# Altium footprint library Conectors.PcbLib: 123 footprints (part 7 of 8)
Each footprint in its own frame and in the unit in brackets; x right, y up, seen from the top. Pads: shape width x height; smd on the part's side, far side on the other; paste and mask are expansions set on the pad; w line width, h text height; cw(c..) or ccw(c..) is an arc to the next point about the centre after c.
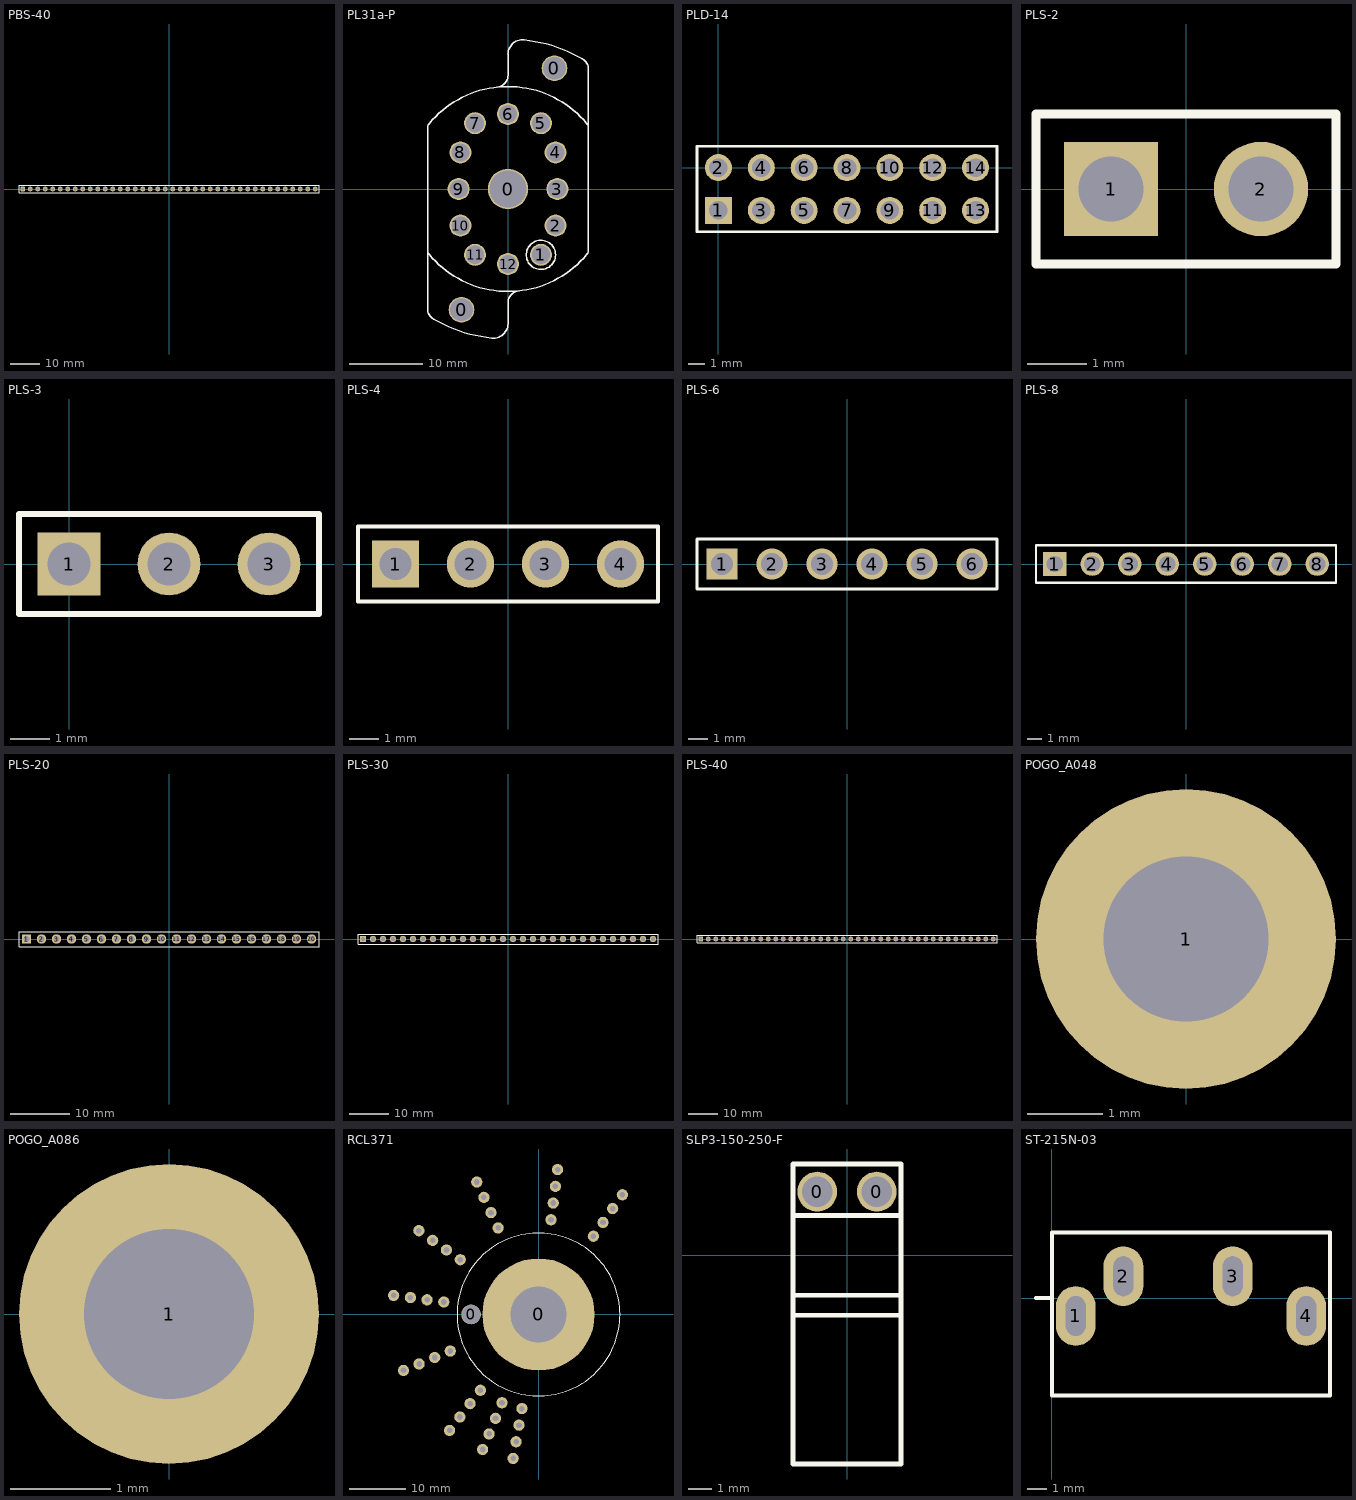
[diagram p6: the footprints below, top view; thin cyan lines are the x and y axes]

## PBS-40 [mm]
pads (40):
  rrect50% 1.6x1.6 hole 1.1: 1(-49.53,0)
  round 1.6 hole 1.1: 2(-46.99,0) 3(-44.45,0) 4(-41.91,0) 5(-39.37,0) 6(-36.83,0) 7(-34.29,0) 8(-31.75,0) 9(-29.21,0) 10(-26.67,0) 11(-24.13,0) 12(-21.59,0) 13(-19.05,0) 14(-16.51,0) 15(-13.97,0) 16(-11.43,0) 17(-8.89,0) 18(-6.35,0) 19(-3.81,0) 20(-1.27,0) 21(1.27,0) 22(3.81,0) 23(6.35,0) 24(8.89,0) 25(11.43,0) 26(13.97,0) 27(16.51,0) 28(19.05,0) 29(21.59,0) 30(24.13,0) 31(26.67,0) 32(29.21,0) 33(31.75,0) 34(34.29,0) 35(36.83,0) 36(39.37,0) 37(41.91,0) 38(44.45,0) 39(46.99,0) 40(49.53,0)
Top Overlay:
  lines w0.15: -50.8,-1.27 0,-1.27 50.8,-1.27 50.8,1.27 0,1.27 -50.8,1.27 -50.8,-1.27
3D body "User Library-DS1023.STEP": height 8.5, standoff -3, extent 30.48,-1.27 33.02,1.27
3D body "User Library-DS1023.STEP": height 8.5, standoff -3, extent 33.02,-1.27 35.56,1.27
3D body "User Library-DS1023.STEP": height 8.5, standoff -3, extent 35.56,-1.27 38.1,1.27
3D body "User Library-DS1023.STEP": height 8.5, standoff -3, extent 38.1,-1.27 40.64,1.27
3D body "User Library-DS1023.STEP": height 8.5, standoff -3, extent 40.64,-1.27 43.18,1.27
3D body "User Library-DS1023.STEP": height 8.5, standoff -3, extent 43.18,-1.27 45.72,1.27
3D body "User Library-DS1023.STEP": height 8.5, standoff -3, extent 45.72,-1.27 48.26,1.27
3D body "User Library-DS1023.STEP": height 8.5, standoff -3, extent 48.26,-1.27 50.8,1.27
3D body "User Library-DS1023.STEP": height 8.5, standoff -3, extent 25.4,-1.27 27.94,1.27
3D body "User Library-DS1023.STEP": height 8.5, standoff -3, extent 27.94,-1.27 30.48,1.27
3D body "User Library-DS1023.STEP": height 8.5, standoff -3, extent 17.78,-1.27 20.32,1.27
3D body "User Library-DS1023.STEP": height 8.5, standoff -3, extent 15.24,-1.27 17.78,1.27
3D body "User Library-DS1023.STEP": height 8.5, standoff -3, extent 12.7,-1.27 15.24,1.27
3D body "User Library-DS1023.STEP": height 8.5, standoff -3, extent 10.16,-1.27 12.7,1.27
3D body "User Library-DS1023.STEP": height 8.5, standoff -3, extent 7.62,-1.27 10.16,1.27
3D body "User Library-DS1023.STEP": height 8.5, standoff -3, extent 5.08,-1.27 7.62,1.27
3D body "User Library-DS1023.STEP": height 8.5, standoff -3, extent 2.54,-1.27 5.08,1.27
3D body "User Library-DS1023.STEP": height 8.5, standoff -3, extent 0,-1.27 2.54,1.27
3D body "User Library-DS1023.STEP": height 8.5, standoff -3, extent 22.86,-1.27 25.4,1.27
3D body "User Library-DS1023.STEP": height 8.5, standoff -3, extent 20.32,-1.27 22.86,1.27
3D body "User Library-DS1023.STEP": height 8.5, standoff -3, extent -33.02,-1.27 -30.48,1.27
3D body "User Library-DS1023.STEP": height 8.5, standoff -3, extent -35.56,-1.27 -33.02,1.27
3D body "User Library-DS1023.STEP": height 8.5, standoff -3, extent -38.1,-1.27 -35.56,1.27
3D body "User Library-DS1023.STEP": height 8.5, standoff -3, extent -40.64,-1.27 -38.1,1.27
3D body "User Library-DS1023.STEP": height 8.5, standoff -3, extent -43.18,-1.27 -40.64,1.27
3D body "User Library-DS1023.STEP": height 8.5, standoff -3, extent -45.72,-1.27 -43.18,1.27
3D body "User Library-DS1023.STEP": height 8.5, standoff -3, extent -48.26,-1.27 -45.72,1.27
3D body "User Library-DS1023.STEP": height 8.5, standoff -3, extent -50.8,-1.27 -48.26,1.27
3D body "User Library-DS1023.STEP": height 8.5, standoff -3, extent -27.94,-1.27 -25.4,1.27
3D body "User Library-DS1023.STEP": height 8.5, standoff -3, extent -30.48,-1.27 -27.94,1.27
3D body "User Library-DS1023.STEP": height 8.5, standoff -3, extent -20.32,-1.27 -17.78,1.27
3D body "User Library-DS1023.STEP": height 8.5, standoff -3, extent -17.78,-1.27 -15.24,1.27
3D body "User Library-DS1023.STEP": height 8.5, standoff -3, extent -15.24,-1.27 -12.7,1.27
3D body "User Library-DS1023.STEP": height 8.5, standoff -3, extent -12.7,-1.27 -10.16,1.27
3D body "User Library-DS1023.STEP": height 8.5, standoff -3, extent -10.16,-1.27 -7.62,1.27
3D body "User Library-DS1023.STEP": height 8.5, standoff -3, extent -7.62,-1.27 -5.08,1.27
3D body "User Library-DS1023.STEP": height 8.5, standoff -3, extent -5.08,-1.27 -2.54,1.27
3D body "User Library-DS1023.STEP": height 8.5, standoff -3, extent -2.54,-1.27 0,1.27
3D body "User Library-DS1023.STEP": height 8.5, standoff -3, extent -25.4,-1.27 -22.86,1.27
3D body "User Library-DS1023.STEP": height 8.5, standoff -3, extent -22.86,-1.27 -20.32,1.27

## PL31a-P [mm]
pads (15):
  round 3.5 hole 3.1: 0(-6.35,-16.5) 0(6.35,16.5)
  round 5.5 hole 5.1: 0(0,0)
  round 3 hole 2.5: 1(4.5,-9) 2(6.5,-5) 3(6.75,0) 4(6.5,5) 5(4.5,9) 6(0,10.25) 7(-4.5,9) 8(-6.5,5) 9(-6.75,0) 10(-6.5,-5) 11(-4.5,-9) 12(0,-10.25)
Top Overlay:
  circle w0.2: c4.5,-9 r2
  lines w0.2: -1.476,13.922 ccw(c-1.65,15.563) 0,15.563 0,18.392 cw(c2,18.392) 2,20.392 cw(c2,18.392) 2.216,20.38 cw(c0,0) 10.168,17.8 cw(c9.35,16.368) 11,16.368 11,8.307 ; 1.476,-13.922 ccw(c1.65,-15.563) 0,-15.563 0,-18.392 cw(c-2,-18.392) -2.216,-20.38 cw(c0,0) -10.168,-17.8 cw(c-9.35,-16.368) -11,-16.368 -11,-8.307 ; -11,-8.307 ccw(c-10,-8.307) -10.769,-8.946 ccw(c0,0) 10.769,-8.946 ccw(c10,-8.307) 11,-8.307 11,8.307 ; -11,-8.307 -11,8.307 cw(c-10,8.307) -10.769,8.946 cw(c0,0) 0,14 cw(c0,0) 10.769,8.946 cw(c10,8.307) 11,8.307
3D body "ИН-12_Колба.STEP": height 37.5, standoff 4.5, extent -10,-15 10,15
3D body "ИН-12_Внутренности.STEP": height 33.5, standoff 4, extent -8.619,-12.5 8.619,12.5
3D body "ПЛ31а-п_коричн.STEP": height 10.4, standoff -5.72, extent -11,-20.392 11,20.38

## PLD-14 [mm]
pads (14):
  rect 1.6x1.6 hole 1.1: 1(0,-2.54)
  round 1.6 hole 1.1: 2(0,0) 3(2.54,-2.54) 4(2.54,0) 5(5.08,-2.54) 6(5.08,0) 7(7.62,-2.54) 8(7.62,0) 9(10.16,-2.54) 10(10.16,0) 11(12.7,-2.54) 12(12.7,0) 13(15.24,-2.54) 14(15.24,0)
Top Overlay:
  lines w0.15: -1.27,-3.81 16.51,-3.81 16.51,1.27 -1.27,1.27 -1.27,-3.81
3D body "PLS-1.STEP": height 8.5, standoff -3, extent 8.89,-3.81 11.43,-1.27
3D body "PLS-1.STEP": height 8.5, standoff -3, extent 11.43,-3.81 13.97,-1.27
3D body "PLS-1.STEP": height 8.5, standoff -3, extent 13.97,-3.81 16.51,-1.27
3D body "PLS-1.STEP": height 8.5, standoff -3, extent 8.89,-1.27 11.43,1.27
3D body "PLS-1.STEP": height 8.5, standoff -3, extent 11.43,-1.27 13.97,1.27
3D body "PLS-1.STEP": height 8.5, standoff -3, extent 13.97,-1.27 16.51,1.27
3D body "PLS-1.STEP": height 8.5, standoff -3, extent -1.27,-3.81 1.27,-1.27
3D body "PLS-1.STEP": height 8.5, standoff -3, extent 1.27,-3.81 3.81,-1.27
3D body "PLS-1.STEP": height 8.5, standoff -3, extent 3.81,-3.81 6.35,-1.27
3D body "PLS-1.STEP": height 8.5, standoff -3, extent 6.35,-3.81 8.89,-1.27
3D body "PLS-1.STEP": height 8.5, standoff -3, extent -1.27,-1.27 1.27,1.27
3D body "PLS-1.STEP": height 8.5, standoff -3, extent 1.27,-1.27 3.81,1.27
3D body "PLS-1.STEP": height 8.5, standoff -3, extent 3.81,-1.27 6.35,1.27
3D body "PLS-1.STEP": height 8.5, standoff -3, extent 6.35,-1.27 8.89,1.27

## PLS-2 [mm]
pads (2):
  rect 1.6x1.6 hole 1.1: 1(-1.27,0)
  round 1.6 hole 1.1: 2(1.27,0)
Top Overlay:
  lines w0.15: -2.54,-1.27 -2.54,1.27 2.54,1.27 2.54,-1.27 -2.54,-1.27
3D body "PLS-1.STEP": height 8.5, standoff -3, extent -2.54,-1.27 0,1.27
3D body "PLS-1.STEP": height 8.5, standoff -3, extent 0,-1.27 2.54,1.27

## PLS-3 [mm]
pads (3):
  rect 1.6x1.6 hole 1.1: 1(0,0)
  round 1.6 hole 1.1: 2(2.54,0) 3(5.08,0)
Top Overlay:
  lines w0.15: -1.27,-1.27 6.35,-1.27 6.35,1.27 -1.27,1.27 -1.27,-1.27
3D body "PLS-1.STEP": height 8.5, standoff -3, extent 3.81,-1.27 6.35,1.27
3D body "PLS-1.STEP": height 8.5, standoff -3, extent 1.27,-1.27 3.81,1.27
3D body "PLS-1.STEP": height 8.5, standoff -3, extent -1.27,-1.27 1.27,1.27

## PLS-4 [mm]
pads (4):
  rect 1.6x1.6 hole 1.1: 1(-3.81,0)
  round 1.6 hole 1.1: 2(-1.27,0) 3(1.27,0) 4(3.81,0)
Top Overlay:
  lines w0.15: -5.08,-1.27 5.08,-1.27 5.08,1.27 -5.08,1.27 -5.08,-1.27
3D body "PLS-1.STEP": height 8.5, standoff -3, extent 2.54,-1.27 5.08,1.27
3D body "PLS-1.STEP": height 8.5, standoff -3, extent 0,-1.27 2.54,1.27
3D body "PLS-1.STEP": height 8.5, standoff -3, extent -2.54,-1.27 0,1.27
3D body "PLS-1.STEP": height 8.5, standoff -3, extent -5.08,-1.27 -2.54,1.27

## PLS-6 [mm]
pads (6):
  rect 1.6x1.6 hole 1.1: 1(-6.35,0)
  round 1.6 hole 1.1: 2(-3.81,0) 3(-1.27,0) 4(1.27,0) 5(3.81,0) 6(6.35,0)
Top Overlay:
  lines w0.15: -7.62,-1.27 -7.62,1.27 2.54,1.27 7.62,1.27 7.62,-1.27 2.54,-1.27 -7.62,-1.27
3D body "PLS-1.STEP": height 8.5, standoff -3, extent 2.54,-1.27 5.08,1.27
3D body "PLS-1.STEP": height 8.5, standoff -3, extent 5.08,-1.27 7.62,1.27
3D body "PLS-1.STEP": height 8.5, standoff -3, extent -7.62,-1.27 -5.08,1.27
3D body "PLS-1.STEP": height 8.5, standoff -3, extent -5.08,-1.27 -2.54,1.27
3D body "PLS-1.STEP": height 8.5, standoff -3, extent -2.54,-1.27 0,1.27
3D body "PLS-1.STEP": height 8.5, standoff -3, extent 0,-1.27 2.54,1.27

## PLS-8 [mm]
pads (8):
  rect 1.6x1.6 hole 1.1: 1(-8.89,0)
  round 1.6 hole 1.1: 2(-6.35,0) 3(-3.81,0) 4(-1.27,0) 5(1.27,0) 6(3.81,0) 7(6.35,0) 8(8.89,0)
Top Overlay:
  lines w0.15: -10.16,-1.27 -10.16,1.27 0,1.27 10.16,1.27 10.16,-1.27 0,-1.27 -10.16,-1.27
3D body "PLS-1.STEP": height 8.5, standoff -3, extent 0,-1.27 2.54,1.27
3D body "PLS-1.STEP": height 8.5, standoff -3, extent 2.54,-1.27 5.08,1.27
3D body "PLS-1.STEP": height 8.5, standoff -3, extent 5.08,-1.27 7.62,1.27
3D body "PLS-1.STEP": height 8.5, standoff -3, extent 7.62,-1.27 10.16,1.27
3D body "PLS-1.STEP": height 8.5, standoff -3, extent -10.16,-1.27 -7.62,1.27
3D body "PLS-1.STEP": height 8.5, standoff -3, extent -7.62,-1.27 -5.08,1.27
3D body "PLS-1.STEP": height 8.5, standoff -3, extent -5.08,-1.27 -2.54,1.27
3D body "PLS-1.STEP": height 8.5, standoff -3, extent -2.54,-1.27 0,1.27

## PLS-20 [mm]
pads (20):
  rect 1.6x1.6 hole 1.1: 1(-24.13,0)
  round 1.6 hole 1.1: 2(-21.59,0) 3(-19.05,0) 4(-16.51,0) 5(-13.97,0) 6(-11.43,0) 7(-8.89,0) 8(-6.35,0) 9(-3.81,0) 10(-1.27,0) 11(1.27,0) 12(3.81,0) 13(6.35,0) 14(8.89,0) 15(11.43,0) 16(13.97,0) 17(16.51,0) 18(19.05,0) 19(21.59,0) 20(24.13,0)
Top Overlay:
  lines w0.15: -25.4,-1.27 25.4,-1.27 25.4,1.27 -25.4,1.27 -25.4,-1.27
3D body "PLS-1.STEP": height 8.5, standoff -3, extent 22.86,-1.27 25.4,1.27
3D body "PLS-1.STEP": height 8.5, standoff -3, extent 20.32,-1.27 22.86,1.27
3D body "PLS-1.STEP": height 8.5, standoff -3, extent 17.78,-1.27 20.32,1.27
3D body "PLS-1.STEP": height 8.5, standoff -3, extent 15.24,-1.27 17.78,1.27
3D body "PLS-1.STEP": height 8.5, standoff -3, extent 12.7,-1.27 15.24,1.27
3D body "PLS-1.STEP": height 8.5, standoff -3, extent 10.16,-1.27 12.7,1.27
3D body "PLS-1.STEP": height 8.5, standoff -3, extent 7.62,-1.27 10.16,1.27
3D body "PLS-1.STEP": height 8.5, standoff -3, extent 5.08,-1.27 7.62,1.27
3D body "PLS-1.STEP": height 8.5, standoff -3, extent 2.54,-1.27 5.08,1.27
3D body "PLS-1.STEP": height 8.5, standoff -3, extent 0,-1.27 2.54,1.27
3D body "PLS-1.STEP": height 8.5, standoff -3, extent -2.54,-1.27 0,1.27
3D body "PLS-1.STEP": height 8.5, standoff -3, extent -5.08,-1.27 -2.54,1.27
3D body "PLS-1.STEP": height 8.5, standoff -3, extent -7.62,-1.27 -5.08,1.27
3D body "PLS-1.STEP": height 8.5, standoff -3, extent -10.16,-1.27 -7.62,1.27
3D body "PLS-1.STEP": height 8.5, standoff -3, extent -12.7,-1.27 -10.16,1.27
3D body "PLS-1.STEP": height 8.5, standoff -3, extent -15.24,-1.27 -12.7,1.27
3D body "PLS-1.STEP": height 8.5, standoff -3, extent -17.78,-1.27 -15.24,1.27
3D body "PLS-1.STEP": height 8.5, standoff -3, extent -20.32,-1.27 -17.78,1.27
3D body "PLS-1.STEP": height 8.5, standoff -3, extent -22.86,-1.27 -20.32,1.27
3D body "PLS-1.STEP": height 8.5, standoff -3, extent -25.4,-1.27 -22.86,1.27

## PLS-30 [mm]
pads (30):
  rect 1.6x1.6 hole 1.1: 1(-36.83,0)
  round 1.6 hole 1.1: 2(-34.29,0) 3(-31.75,0) 4(-29.21,0) 5(-26.67,0) 6(-24.13,0) 7(-21.59,0) 8(-19.05,0) 9(-16.51,0) 10(-13.97,0) 11(-11.43,0) 12(-8.89,0) 13(-6.35,0) 14(-3.81,0) 15(-1.27,0) 16(1.27,0) 17(3.81,0) 18(6.35,0) 19(8.89,0) 20(11.43,0) 21(13.97,0) 22(16.51,0) 23(19.05,0) 24(21.59,0) 25(24.13,0) 26(26.67,0) 27(29.21,0) 28(31.75,0) 29(34.29,0) 30(36.83,0)
Top Overlay:
  lines w0.15: -38.1,-1.27 0,-1.27 38.1,-1.27 38.1,1.27 0,1.27 -38.1,1.27 -38.1,-1.27
3D body "PLS-1.STEP": height 8.5, standoff -3, extent 12.7,-1.27 15.24,1.27
3D body "PLS-1.STEP": height 8.5, standoff -3, extent 15.24,-1.27 17.78,1.27
3D body "PLS-1.STEP": height 8.5, standoff -3, extent 17.78,-1.27 20.32,1.27
3D body "PLS-1.STEP": height 8.5, standoff -3, extent 20.32,-1.27 22.86,1.27
3D body "PLS-1.STEP": height 8.5, standoff -3, extent 22.86,-1.27 25.4,1.27
3D body "PLS-1.STEP": height 8.5, standoff -3, extent 25.4,-1.27 27.94,1.27
3D body "PLS-1.STEP": height 8.5, standoff -3, extent 27.94,-1.27 30.48,1.27
3D body "PLS-1.STEP": height 8.5, standoff -3, extent 30.48,-1.27 33.02,1.27
3D body "PLS-1.STEP": height 8.5, standoff -3, extent 33.02,-1.27 35.56,1.27
3D body "PLS-1.STEP": height 8.5, standoff -3, extent 35.56,-1.27 38.1,1.27
3D body "PLS-1.STEP": height 8.5, standoff -3, extent 10.16,-1.27 12.7,1.27
3D body "PLS-1.STEP": height 8.5, standoff -3, extent 7.62,-1.27 10.16,1.27
3D body "PLS-1.STEP": height 8.5, standoff -3, extent 5.08,-1.27 7.62,1.27
3D body "PLS-1.STEP": height 8.5, standoff -3, extent 2.54,-1.27 5.08,1.27
3D body "PLS-1.STEP": height 8.5, standoff -3, extent 0,-1.27 2.54,1.27
3D body "PLS-1.STEP": height 8.5, standoff -3, extent -2.54,-1.27 0,1.27
3D body "PLS-1.STEP": height 8.5, standoff -3, extent -5.08,-1.27 -2.54,1.27
3D body "PLS-1.STEP": height 8.5, standoff -3, extent -7.62,-1.27 -5.08,1.27
3D body "PLS-1.STEP": height 8.5, standoff -3, extent -10.16,-1.27 -7.62,1.27
3D body "PLS-1.STEP": height 8.5, standoff -3, extent -12.7,-1.27 -10.16,1.27
3D body "PLS-1.STEP": height 8.5, standoff -3, extent -15.24,-1.27 -12.7,1.27
3D body "PLS-1.STEP": height 8.5, standoff -3, extent -17.78,-1.27 -15.24,1.27
3D body "PLS-1.STEP": height 8.5, standoff -3, extent -20.32,-1.27 -17.78,1.27
3D body "PLS-1.STEP": height 8.5, standoff -3, extent -22.86,-1.27 -20.32,1.27
3D body "PLS-1.STEP": height 8.5, standoff -3, extent -25.4,-1.27 -22.86,1.27
3D body "PLS-1.STEP": height 8.5, standoff -3, extent -27.94,-1.27 -25.4,1.27
3D body "PLS-1.STEP": height 8.5, standoff -3, extent -30.48,-1.27 -27.94,1.27
3D body "PLS-1.STEP": height 8.5, standoff -3, extent -33.02,-1.27 -30.48,1.27
3D body "PLS-1.STEP": height 8.5, standoff -3, extent -35.56,-1.27 -33.02,1.27
3D body "PLS-1.STEP": height 8.5, standoff -3, extent -38.1,-1.27 -35.56,1.27

## PLS-40 [mm]
pads (40):
  rect 1.6x1.6 hole 1.1: 1(-49.53,0)
  round 1.6 hole 1.1: 2(-46.99,0) 3(-44.45,0) 4(-41.91,0) 5(-39.37,0) 6(-36.83,0) 7(-34.29,0) 8(-31.75,0) 9(-29.21,0) 10(-26.67,0) 11(-24.13,0) 12(-21.59,0) 13(-19.05,0) 14(-16.51,0) 15(-13.97,0) 16(-11.43,0) 17(-8.89,0) 18(-6.35,0) 19(-3.81,0) 20(-1.27,0) 21(1.27,0) 22(3.81,0) 23(6.35,0) 24(8.89,0) 25(11.43,0) 26(13.97,0) 27(16.51,0) 28(19.05,0) 29(21.59,0) 30(24.13,0) 31(26.67,0) 32(29.21,0) 33(31.75,0) 34(34.29,0) 35(36.83,0) 36(39.37,0) 37(41.91,0) 38(44.45,0) 39(46.99,0) 40(49.53,0)
Top Overlay:
  lines w0.15: -50.8,-1.27 -50.8,1.27 0,1.27 50.8,1.27 50.8,-1.27 0,-1.27 -50.8,-1.27
3D body "PLS-1.STEP": height 8.5, standoff -3, extent -50.8,-1.27 -48.26,1.27
3D body "PLS-1.STEP": height 8.5, standoff -3, extent -48.26,-1.27 -45.72,1.27
3D body "PLS-1.STEP": height 8.5, standoff -3, extent -45.72,-1.27 -43.18,1.27
3D body "PLS-1.STEP": height 8.5, standoff -3, extent -43.18,-1.27 -40.64,1.27
3D body "PLS-1.STEP": height 8.5, standoff -3, extent -40.64,-1.27 -38.1,1.27
3D body "PLS-1.STEP": height 8.5, standoff -3, extent -38.1,-1.27 -35.56,1.27
3D body "PLS-1.STEP": height 8.5, standoff -3, extent -35.56,-1.27 -33.02,1.27
3D body "PLS-1.STEP": height 8.5, standoff -3, extent -33.02,-1.27 -30.48,1.27
3D body "PLS-1.STEP": height 8.5, standoff -3, extent -30.48,-1.27 -27.94,1.27
3D body "PLS-1.STEP": height 8.5, standoff -3, extent -27.94,-1.27 -25.4,1.27
3D body "PLS-1.STEP": height 8.5, standoff -3, extent -25.4,-1.27 -22.86,1.27
3D body "PLS-1.STEP": height 8.5, standoff -3, extent -22.86,-1.27 -20.32,1.27
3D body "PLS-1.STEP": height 8.5, standoff -3, extent -20.32,-1.27 -17.78,1.27
3D body "PLS-1.STEP": height 8.5, standoff -3, extent -17.78,-1.27 -15.24,1.27
3D body "PLS-1.STEP": height 8.5, standoff -3, extent -15.24,-1.27 -12.7,1.27
3D body "PLS-1.STEP": height 8.5, standoff -3, extent -12.7,-1.27 -10.16,1.27
3D body "PLS-1.STEP": height 8.5, standoff -3, extent -10.16,-1.27 -7.62,1.27
3D body "PLS-1.STEP": height 8.5, standoff -3, extent -7.62,-1.27 -5.08,1.27
3D body "PLS-1.STEP": height 8.5, standoff -3, extent -5.08,-1.27 -2.54,1.27
3D body "PLS-1.STEP": height 8.5, standoff -3, extent -2.54,-1.27 0,1.27
3D body "PLS-1.STEP": height 8.5, standoff -3, extent 48.26,-1.27 50.8,1.27
3D body "PLS-1.STEP": height 8.5, standoff -3, extent 45.72,-1.27 48.26,1.27
3D body "PLS-1.STEP": height 8.5, standoff -3, extent 43.18,-1.27 45.72,1.27
3D body "PLS-1.STEP": height 8.5, standoff -3, extent 40.64,-1.27 43.18,1.27
3D body "PLS-1.STEP": height 8.5, standoff -3, extent 38.1,-1.27 40.64,1.27
3D body "PLS-1.STEP": height 8.5, standoff -3, extent 35.56,-1.27 38.1,1.27
3D body "PLS-1.STEP": height 8.5, standoff -3, extent 33.02,-1.27 35.56,1.27
3D body "PLS-1.STEP": height 8.5, standoff -3, extent 30.48,-1.27 33.02,1.27
3D body "PLS-1.STEP": height 8.5, standoff -3, extent 27.94,-1.27 30.48,1.27
3D body "PLS-1.STEP": height 8.5, standoff -3, extent 25.4,-1.27 27.94,1.27
3D body "PLS-1.STEP": height 8.5, standoff -3, extent 22.86,-1.27 25.4,1.27
3D body "PLS-1.STEP": height 8.5, standoff -3, extent 20.32,-1.27 22.86,1.27
3D body "PLS-1.STEP": height 8.5, standoff -3, extent 17.78,-1.27 20.32,1.27
3D body "PLS-1.STEP": height 8.5, standoff -3, extent 15.24,-1.27 17.78,1.27
3D body "PLS-1.STEP": height 8.5, standoff -3, extent 12.7,-1.27 15.24,1.27
3D body "PLS-1.STEP": height 8.5, standoff -3, extent 10.16,-1.27 12.7,1.27
3D body "PLS-1.STEP": height 8.5, standoff -3, extent 7.62,-1.27 10.16,1.27
3D body "PLS-1.STEP": height 8.5, standoff -3, extent 5.08,-1.27 7.62,1.27
3D body "PLS-1.STEP": height 8.5, standoff -3, extent 2.54,-1.27 5.08,1.27
3D body "PLS-1.STEP": height 8.5, standoff -3, extent 0,-1.27 2.54,1.27

## POGO_A048 [mm]
pads (1):
  round 4 hole 2.2: 1(0,0)
3D body "pogo-pin A048.STEP": height 12.5, standoff -2, extent -1.75,-1.75 1.75,1.75

## POGO_A086 [mm]
pads (1):
  round 3 hole 1.7: 1(0,0)
3D body "А083.STEP": height 6.5, standoff -2, extent -1.5,-1.5 1.5,1.5

## RCL371 [mm]
pads (38):
  round 3.5 hole 3.3: 0(-12,0)
  round 20 hole 10: 0(0,0)
  round 2 hole 1: S_1_1(-2.952,-16.742) S_1_2(-10.349,-13.487) S_1_3(-15.706,-6.506) S_1_4(-16.855,2.219) S_1_5(-13.926,9.751) S_1_6(-7.185,15.407) S_1_7(2.219,16.855) S_1_8(9.751,13.926) S_1_С1(-6.506,-15.706) S_2_1(-3.473,-19.696) S_2_2(-12.175,-15.867) S_2_3(-18.478,-7.654) S_2_4(-19.829,2.611) S_2_5(-16.383,11.472) S_2_6(-8.452,18.126) S_2_7(2.611,19.829) S_2_8(11.472,16.383) S_2_С1(-7.654,-18.478) S_3_1(-3.994,-22.651) S_3_2(-14.002,-18.247) S_3_3(-21.249,-8.802) S_3_4(-22.803,3.002) S_3_5(-18.841,13.192) S_3_6(-9.72,20.845) S_3_7(3.002,22.803) S_3_8(13.192,18.841) S_3_С1(-8.802,-21.249) S_4_1(-4.515,-25.605) S_4_2(-15.828,-20.627) S_4_3(-24.021,-9.95) S_4_4(-25.778,3.394) S_4_5(-21.298,14.913) S_4_6(-10.988,23.564) S_4_7(3.394,25.778) S_4_8(14.913,21.298) S_4_С1(-9.95,-24.021)
Top Overlay:
  circle w0.2: c0,0 r14.5

## SLP3-150-250-F [mm]
pads (2):
  round 1.7 hole 1.3: 0(-1.27,2.72) 0(1.27,2.72)
Top Overlay:
  lines w0.2: -2.3,-2.55 2.3,-2.55 ; -2.25,-1.7 2.25,-1.7 ; -2.25,1.7 2.25,1.7 ; -2.3,-8.9 -2.3,3.9 2.3,3.9 2.3,-8.9 -2.3,-8.9
3D body "SLP3-150-250-F.step": height 5.41, standoff -1.5, extent -2.261,-8.84 2.261,3.86

## ST-215N-03 [mm]
pads (4):
  oval 2x3 hole 2 slot 1 at 0 deg: 1(1.2,-0.9) 2(3.6,1.1) 3(9.1,1.1) 4(12.8,-0.9)
Top Overlay:
  lines w0.2: -0.8,0 0,0 ; 0,-4.9 0,3.3 14,3.3 14,-4.9 0,-4.9
3D body "CUI_DEVICES_SJ1-3534N.step": height 12.4, standoff -3.2, extent -4,-4.9 14,3.3